# Altium footprint library Tomra_Cadstar_Footprints.PcbLib: 380 footprints (part 15 of 24)
Each footprint in its own frame and in the unit in brackets; x right, y up, seen from the top. Pads: shape width x height; smd on the part's side, far side on the other; paste and mask are expansions set on the pad; w line width, h text height; cw(c..) or ccw(c..) is an arc to the next point about the centre after c.
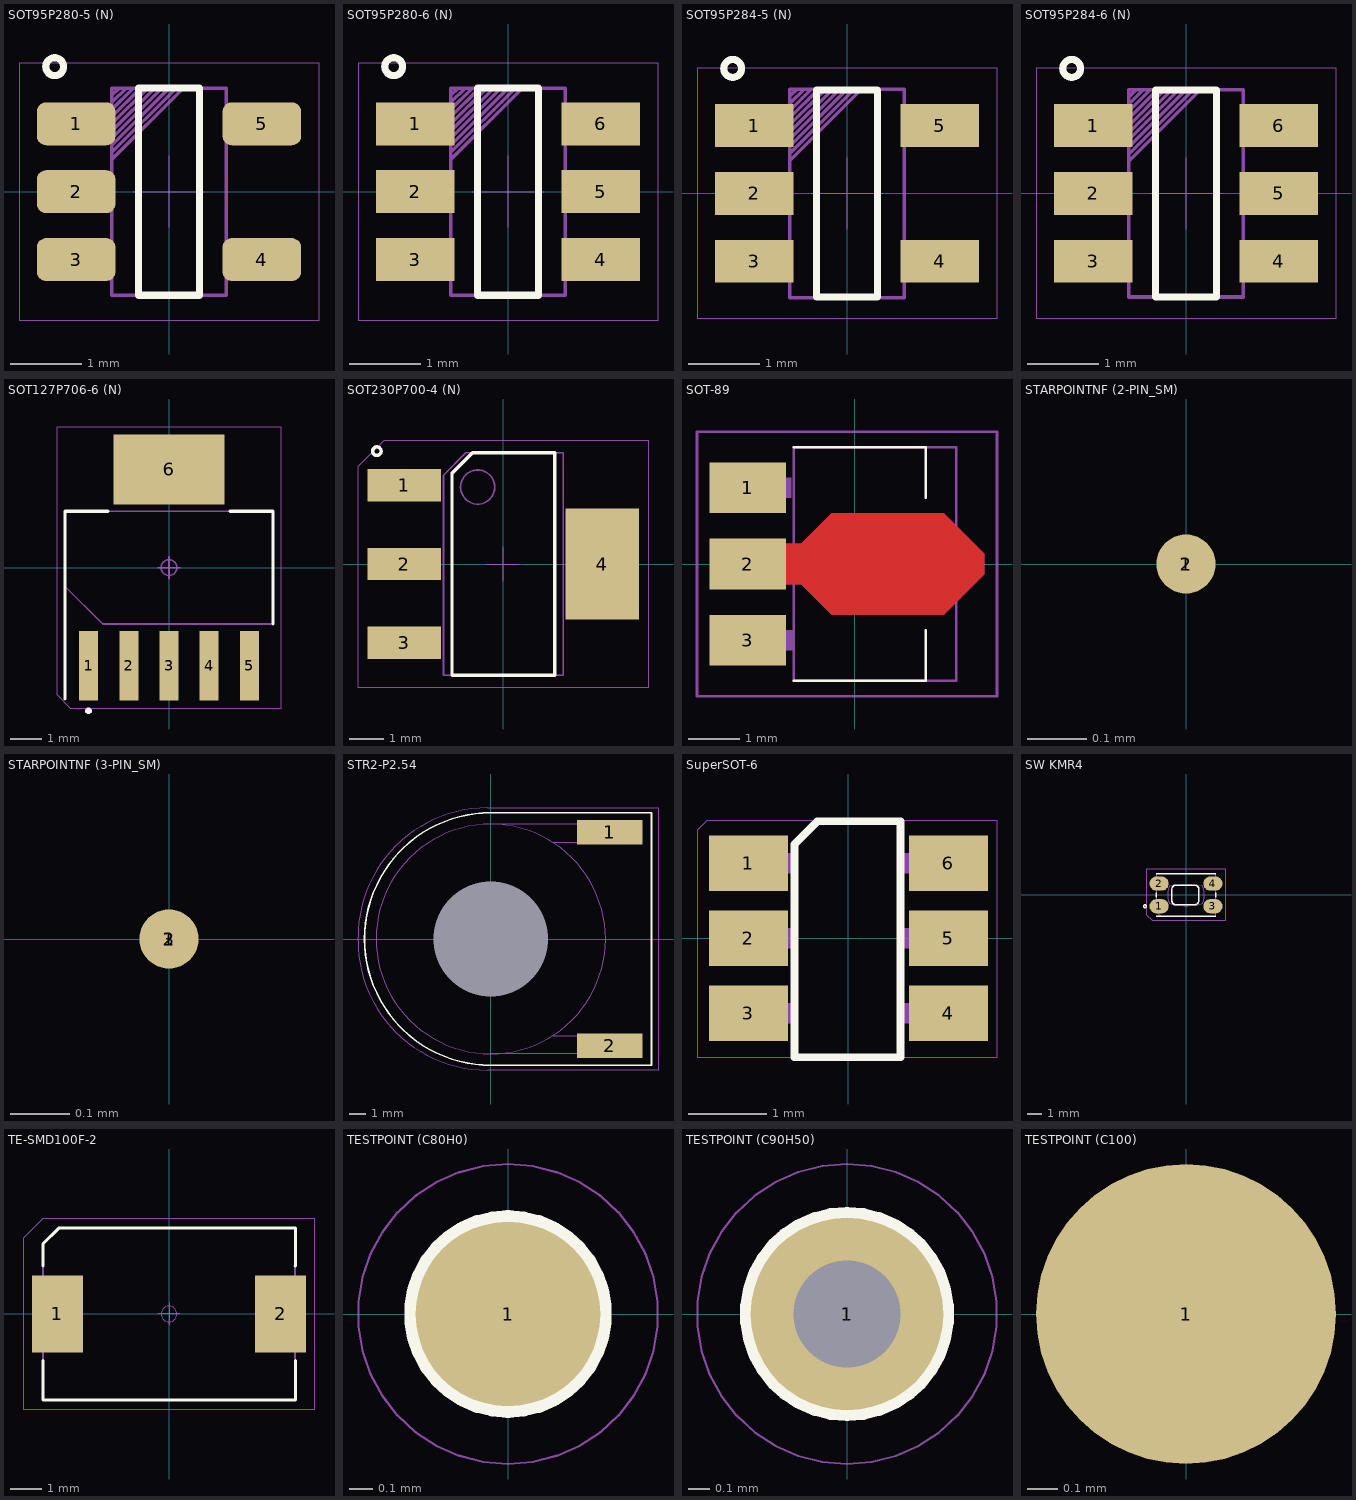
[diagram p14: the footprints below, top view; thin cyan lines are the x and y axes]

## SOT95P280-5 (N) [mm]
height 1.45
pads (5):
  rrect42% 1.1x0.6 smd paste+0 mask+0: 1(-1.3,0.95) 2(-1.3,0) 3(-1.3,-0.95) 4(1.3,-0.95) 5(1.3,0.95)
Top Silk:
  lines w0.1: -1.725,1.75 cw(c-1.6,1.75) -1.475,1.75 cw(c-1.6,1.75) -1.725,1.75 ; -0.425,-1.45 0.425,-1.45 0.425,1.45 -0.425,1.45 -0.425,-1.45
  text ".Designator" at -3.599,-0.35 h0.7
Top Assembly:
  lines w0.05: -0.8,0.45 0.2,1.45 ; -0.8,0.55 0.1,1.45 ; -0.8,0.65 0,1.45 ; -0.8,0.75 -0.1,1.45 ; -0.8,0.85 -0.2,1.45 ; -0.8,0.95 -0.3,1.45 ; -0.8,1.05 -0.4,1.45 ; -0.8,1.15 -0.5,1.45 ; -0.8,1.25 -0.6,1.45 ; -0.8,1.35 -0.7,1.45 ; -0.8,-1.45 0.8,-1.45 0.8,1.45 -0.8,1.45 -0.8,-1.45
Top Placement:
  lines w0.01: -0.5,0 0.5,0 ; 0,-0.5 0,0.5 ; -2.1,-1.8 2.1,-1.8 2.1,1.8 -2.1,1.8 -2.1,-1.8

## SOT95P280-6 (N) [mm]
height 1.45
pads (6):
  rect 1.1x0.6 smd paste+0 mask+0: 1(-1.3,0.95) 2(-1.3,0) 3(-1.3,-0.95) 4(1.3,-0.95) 5(1.3,0) 6(1.3,0.95)
Top Silk:
  lines w0.1: -1.725,1.75 cw(c-1.6,1.75) -1.475,1.75 cw(c-1.6,1.75) -1.725,1.75 ; -0.425,-1.45 0.425,-1.45 0.425,1.45 -0.425,1.45 -0.425,-1.45
  text ".Designator" at -3.599,-0.35 h0.7
Top Assembly:
  lines w0.05: -0.8,0.45 0.2,1.45 ; -0.8,0.55 0.1,1.45 ; -0.8,0.65 0,1.45 ; -0.8,0.75 -0.1,1.45 ; -0.8,0.85 -0.2,1.45 ; -0.8,0.95 -0.3,1.45 ; -0.8,1.05 -0.4,1.45 ; -0.8,1.15 -0.5,1.45 ; -0.8,1.25 -0.6,1.45 ; -0.8,1.35 -0.7,1.45 ; -0.8,-1.45 0.8,-1.45 0.8,1.45 -0.8,1.45 -0.8,-1.45
Top Placement:
  lines w0.01: -0.5,0 0.5,0 ; 0,-0.5 0,0.5 ; -2.1,-1.8 2.1,-1.8 2.1,1.8 -2.1,1.8 -2.1,-1.8

## SOT95P284-5 (N) [mm]
height 1.22
pads (5):
  rect 1.1x0.6 smd paste+0 mask+0: 1(-1.3,0.95) 2(-1.3,0) 3(-1.3,-0.95) 4(1.3,-0.95) 5(1.3,0.95)
Top Silk:
  lines w0.1: -1.725,1.75 cw(c-1.6,1.75) -1.475,1.75 cw(c-1.6,1.75) -1.725,1.75 ; -0.425,-1.45 0.425,-1.45 0.425,1.45 -0.425,1.45 -0.425,-1.45
  text ".Designator" at -3.599,-0.35 h0.7
Top Assembly:
  lines w0.05: -0.8,0.46 0.2,1.46 ; -0.8,0.56 0.1,1.46 ; -0.8,0.66 0,1.46 ; -0.8,0.76 -0.1,1.46 ; -0.8,0.86 -0.2,1.46 ; -0.8,0.96 -0.3,1.46 ; -0.8,1.06 -0.4,1.46 ; -0.8,1.16 -0.5,1.46 ; -0.8,1.26 -0.6,1.46 ; -0.8,1.36 -0.7,1.46 ; -0.8,-1.46 0.8,-1.46 0.8,1.46 -0.8,1.46 -0.8,-1.46
Top Placement:
  lines w0.01: -0.5,0 0.5,0 ; 0,-0.5 0,0.5 ; -2.1,-1.75 2.1,-1.75 2.1,1.75 -2.1,1.75 -2.1,-1.75

## SOT95P284-6 (N) [mm]
height 1.22
pads (6):
  rect 1.1x0.6 smd paste+0 mask+0: 1(-1.3,0.95) 2(-1.3,0) 3(-1.3,-0.95) 4(1.3,-0.95) 5(1.3,0) 6(1.3,0.95)
Top Silk:
  lines w0.1: -1.725,1.75 cw(c-1.6,1.75) -1.475,1.75 cw(c-1.6,1.75) -1.725,1.75 ; -0.425,-1.45 0.425,-1.45 0.425,1.45 -0.425,1.45 -0.425,-1.45
  text ".Designator" at -3.599,-0.35 h0.7
Top Assembly:
  lines w0.05: -0.8,0.45 0.2,1.45 ; -0.8,0.55 0.1,1.45 ; -0.8,0.65 0,1.45 ; -0.8,0.75 -0.1,1.45 ; -0.8,0.85 -0.2,1.45 ; -0.8,0.95 -0.3,1.45 ; -0.8,1.05 -0.4,1.45 ; -0.8,1.15 -0.5,1.45 ; -0.8,1.25 -0.6,1.45 ; -0.8,1.35 -0.7,1.45 ; -0.8,-1.45 0.8,-1.45 0.8,1.45 -0.8,1.45 -0.8,-1.45
Top Placement:
  lines w0.01: -0.5,0 0.5,0 ; 0,-0.5 0,0.5 ; -2.1,-1.75 2.1,-1.75 2.1,1.75 -2.1,1.75 -2.1,-1.75

## SOT127P706-6 (N) [mm]
height 1.8
pads (6):
  rect 0.6x2.2 smd paste+0 mask+0: 1(-2.54,-3.1) 2(-1.27,-3.1) 3(0,-3.1) 4(1.27,-3.1) 5(2.54,-3.1)
  rect 3.5x2.2 smd paste+0 mask+0: 6(0,3.1)
Top Silk:
  region: -2.64,-4.52 -2.64,-4.479 -2.581,-4.42 -2.499,-4.42 -2.44,-4.479 -2.44,-4.52 -2.44,-4.561 -2.499,-4.62 -2.581,-4.62 -2.64,-4.561
  lines w0.1: -3.28,-4.14 -3.28,1.78 -1.93,1.78 ; 1.93,1.78 3.28,1.78 3.28,-1.78
  text ".Designator" at -3.599,-0.35 h0.7
Top Assembly:
  lines w0.05: -3.28,-0.593 -2.093,-1.78 3.28,-1.78 3.28,1.78 -3.28,1.78 -3.28,-0.593
Top Placement:
  lines w0.01: -3.53,-4.02 -3.1,-4.45 3.53,-4.45 3.53,4.45 -3.53,4.45 -3.53,-4.02
  lines w0.05: -0.35,0 0.35,0 ; 0,-0.35 0,0.35 ; -0.25,0 cw(c0,0) 0.25,0 cw(c0,0) -0.25,0

## SOT230P700-4 (N) [mm]
height 1.8
pads (4):
  rect 2.15x0.95 smd paste+0 mask+0: 1(-2.9,2.3) 2(-2.9,0) 3(-2.9,-2.3)
  rect 2.15x3.25 smd paste+0 mask+0: 4(2.9,0)
Top Silk:
  lines w0.1: -3.825,3.3 cw(c-3.7,3.3) -3.575,3.3 cw(c-3.7,3.3) -3.825,3.3 ; -1.5,-3.25 1.5,-3.25 1.5,3.25 -0.9,3.25 -1.5,2.65 -1.5,-3.25
  text ".Designator" at 0,0 h0.7
Top Assembly:
  lines w0.05: -1.75,-3.25 1.75,-3.25 1.75,3.25 -1.1,3.25 -1.75,2.6 -1.75,-3.25 ; -1.25,2.25 cw(c-0.75,2.25) -0.25,2.25 cw(c-0.75,2.25) -1.25,2.25
Top Placement:
  lines w0.01: -0.5,0 0.5,0 ; 0,-0.5 0,0.5 ; -4.25,-3.6 4.25,-3.6 4.25,3.6 -3.5,3.6 -4.25,2.85 -4.25,-3.6

## SOT-89 [mm]
height 1.8
pads (3):
  rrect0% 1.5x1 smd paste+0 mask+0: 1(-2.1,1.5) 2(-2.1,0) 3(-2.1,-1.5)
Top Elec:
  region: -2.5,0.4 -2.5,-0.4 -1.05,-0.4 -0.45,-1 1.75,-1 2.55,-0.2 2.55,0.2 1.75,1 -0.45,1 -1.05,0.4
Top Silk:
  lines w0.05: -1.2,-2.3 1.4,-2.3 1.4,-1.3 ; -1.2,2.3 1.4,2.3 1.4,1.3
  text ".Designator" at -1.2,2.3 h0.7
Top Paste:
  region: -2.5,0.4 -2.5,-0.4 -1.05,-0.4 -0.45,-1 1.75,-1 2.55,-0.2 2.55,0.2 1.75,1 -0.45,1 -1.05,0.4
Top Solder Resist:
  region: -2.5,0.4 -2.5,-0.4 -1.05,-0.4 -0.45,-1 1.75,-1 2.55,-0.2 2.55,0.2 1.75,1 -0.45,1 -1.05,0.4
Drill:
  region: -2.5,0.4 -2.5,-0.4 -1.05,-0.4 -0.45,-1 1.75,-1 2.55,-0.2 2.55,0.2 1.75,1 -0.45,1 -1.05,0.4
Top Assembly:
  region: -1.2,0.25 -1.2,-0.25 -2.45,-0.25 -2.45,0.25
  region: 1.4,0.75 1.85,0.75 1.85,-0.85 1.4,-0.85
  region: -1.25,1.7 -1.25,1.3 -2.45,1.3 -2.45,1.7
  region: -1.2,-1.3 -1.2,-1.7 -2.4,-1.7 -2.4,-1.3
  lines w0.05: -1.2,-2.3 2,-2.3 2,2.3 -1.2,2.3 -1.2,-2.3
Top Placement:
  lines w0.05: -3.1,-2.6 2.8,-2.6 2.8,2.6 -3.1,2.6 -3.1,-2.6

## STARPOINTNF (2-PIN_SM) [mm]
pads (2):
  round 0.1 smd paste+0 mask+0: 1(0,0) 2(0,0)
Top Silk:
  text ".Designator" at 0,0 h0.7
Top Placement:
  lines w0.01: 0,-0.01 cw(c0,0) 0,0.01 cw(c0,0) 0,-0.01

## STARPOINTNF (3-PIN_SM) [mm]
pads (3):
  round 0.1 smd paste+0 mask+0: 1(0,0) 2(0,0) 3(0,0)
Top Silk:
  text ".Designator" at 0,0 h0.7
Top Placement:
  lines w0.01: 0,-0.01 cw(c0,0) 0,0.01 cw(c0,0) 0,-0.01

## STR2-P2.54 [mm]
height 5
pads (3):
  rect 4x1.5 smd paste+0 mask+0: 1(7.25,6.5) 2(7.25,-6.5)
  round 0 / inner round 1.524 / far side round 0 hole 7 paste+0 mask+0: 3(0,0)
Top Silk:
  lines w0.1: -7.7,0 ccw(c0,0) 0,-7.7 9.8,-7.7 9.8,7.7 0,7.7 ccw(c0,0) -7.7,0
  text ".Designator" at -0.2,8 h0.7
Top Assembly:
  lines w0.05: 3.8,-5.9 8.9,-5.9 8.9,-7 0,-7 ; 3.8,5.9 8.9,5.9 8.9,7 0,7 ; 0,-7 cw(c0,0) 0,7 ; 0,-7 ccw(c0,0) 0,7
Top Placement:
  lines w0.01: -8.1,-0.1 ccw(c-0.2,-0.1) -0.2,-8 10.2,-8 10.2,8 -0.2,8 ccw(c-0.2,0.1) -8.1,0.1 -8.1,-0.1

## SuperSOT-6 [mm]
height 1.22
pads (6):
  rect 1x0.7 smd paste+0 mask+0: 1(-1.27,0.953) 2(-1.27,0) 3(-1.27,-0.953) 4(1.27,-0.953) 5(1.27,0) 6(1.27,0.953)
Top Silk:
  lines w0.1: -0.686,-1.511 -0.686,1.194 -0.394,1.486 0.66,1.486 0.66,-1.511 -0.686,-1.511
  text ".Designator" at 0,0 h0.7
Top Assembly:
  region: 1.175,-0.825 1.175,-1.079 0.642,-1.079 0.642,-0.825
  region: -0.705,1.08 -0.705,0.826 -1.238,0.826 -1.238,1.08
  region: -0.705,-0.825 -0.705,-1.079 -1.238,-1.079 -1.238,-0.825
  region: 1.175,0.128 1.175,-0.126 0.642,-0.126 0.642,0.128
  region: -0.705,0.128 -0.705,-0.126 -1.238,-0.126 -1.238,0.128
  region: 1.175,1.08 1.175,0.826 0.642,0.826 0.642,1.08
  lines w0.05: -0.705,-1.511 -0.705,1.194 -0.412,1.486 0.642,1.486 0.642,-1.511 -0.705,-1.511
Top Placement:
  lines w0.01: -1.924,-1.511 -1.924,1.369 -1.8,1.493 1.886,1.493 1.886,-1.511 -1.924,-1.511

## SW KMR4 [mm]
height 2.5
pads (4):
  oval 1.356x1 smd paste+0 mask+0: 1(-1.9,-0.8) 2(-1.9,0.8) 3(1.9,-0.8) 4(1.9,0.8)
Top Silk:
  lines w0.1: -2.1,-1.5 2.1,-1.5 ; -2.1,-0.15 -2.1,0.15 ; -2.1,1.5 2.1,1.5 ; 2.1,-0.15 2.1,0.15 ; -2.9,-0.9 cw(c-2.9,-0.8) -2.9,-0.7 cw(c-2.9,-0.8) -2.9,-0.9 ; -1,-0.4 ccw(c-0.7,-0.4) -0.7,-0.7 0.6,-0.7 ccw(c0.6,-0.4) 0.9,-0.4 0.9,0.4 ccw(c0.6,0.4) 0.6,0.7 -0.7,0.7 ccw(c-0.7,0.4) -1,0.4 -1,-0.4
  text ".Designator" at -2.1,1.5 h0.7
Top Assembly:
  lines w0.05: -2.1,-1.2 -1.8,-1.5 2.1,-1.5 2.1,1.5 -2.1,1.5 -2.1,-1.2 ; -1.2,-0.6 ccw(c0,3.35) 1.2,-0.6 ccw(c-0.55,0) 1.2,0.6 ccw(c0,-6.5) -1.2,0.6 ccw(c0.55,0) -1.2,-0.6
Top Placement:
  lines w0.01: -2.8,-1.4 -2.4,-1.8 2.8,-1.8 2.8,1.8 -2.8,1.8 -2.8,-1.4

## TE-SMD100F-2 [mm]
height 3
pads (2):
  rect 1.62x2.43 smd paste+0 mask+0: 1(-3.535,0) 2(3.535,0)
Top Silk:
  lines w0.1: -3.99,-2.68 -3.99,-1.48 -3.99,-2.72 ; -3.99,1.52 -3.99,2.22 -3.49,2.72 4.01,2.72 4.01,1.52 3.99,1.52 ; 3.99,-2.72 -3.99,-2.72 ; 4.01,-2.68 4.01,-1.48 4.01,-2.72 -3.99,-2.72
  text ".Designator" at -3.599,-0.35 h0.7
Top Assembly:
  lines w0.05: -3.99,-2.72 -3.99,2.22 -3.49,2.72 3.99,2.72 3.99,-2.72 -3.99,-2.72
Top Placement:
  lines w0.01: -0.35,0 0.35,0 ; 0,-0.35 0,0.35 ; -4.6,-3.03 -4.6,2.42 -3.99,3.03 4.6,3.03 4.6,-3.03 -4.6,-3.03 ; -0.25,0 cw(c0,0) 0.25,0 cw(c0,0) -0.25,0

## TESTPOINT (C80H0) [mm]
pads (1):
  round 0.8 smd paste-0.8 mask+0: 1(0,0)
Top Silk:
  lines w0.1: 0,-0.4 cw(c0,0) 0,0.4 cw(c0,0) 0,-0.4
  text ".Designator" at 0,0 h0.7
Top Assembly:
  lines w0.05: 0,-0.4 cw(c0,0) 0,0.4 cw(c0,0) 0,-0.4
Top Placement:
  lines w0.01: 0,-0.65 cw(c0,0) 0,0.65 cw(c0,0) 0,-0.65

## TESTPOINT (C90H50) [mm]
pads (1):
  round 0.9 / inner round 1.524 / far side round 0.9 hole 0.5 paste+0 mask+0: 1(0,0)
Top Silk:
  lines w0.1: 0,-0.45 cw(c0,0) 0,0.45 cw(c0,0) 0,-0.45
  text ".Designator" at 0,0 h0.7
Top Assembly:
  lines w0.05: 0,-0.45 cw(c0,0) 0,0.45 cw(c0,0) 0,-0.45
Top Placement:
  lines w0.01: 0,-0.7 cw(c0,0) 0,0.7 cw(c0,0) 0,-0.7

## TESTPOINT (C100) [mm]
pads (1):
  round 1 smd paste+0 mask+0: 1(0,0)
Top Silk:
  text ".Designator" at 0,0 h0.7